# Altium footprint library North POLE.PcbLib: 419 footprints (part 8 of 27)
Each footprint in its own frame and in the unit in brackets; x right, y up, seen from the top. Pads: shape width x height; smd on the part's side, far side on the other; paste and mask are expansions set on the pad; w line width, h text height; cw(c..) or ccw(c..) is an arc to the next point about the centre after c.
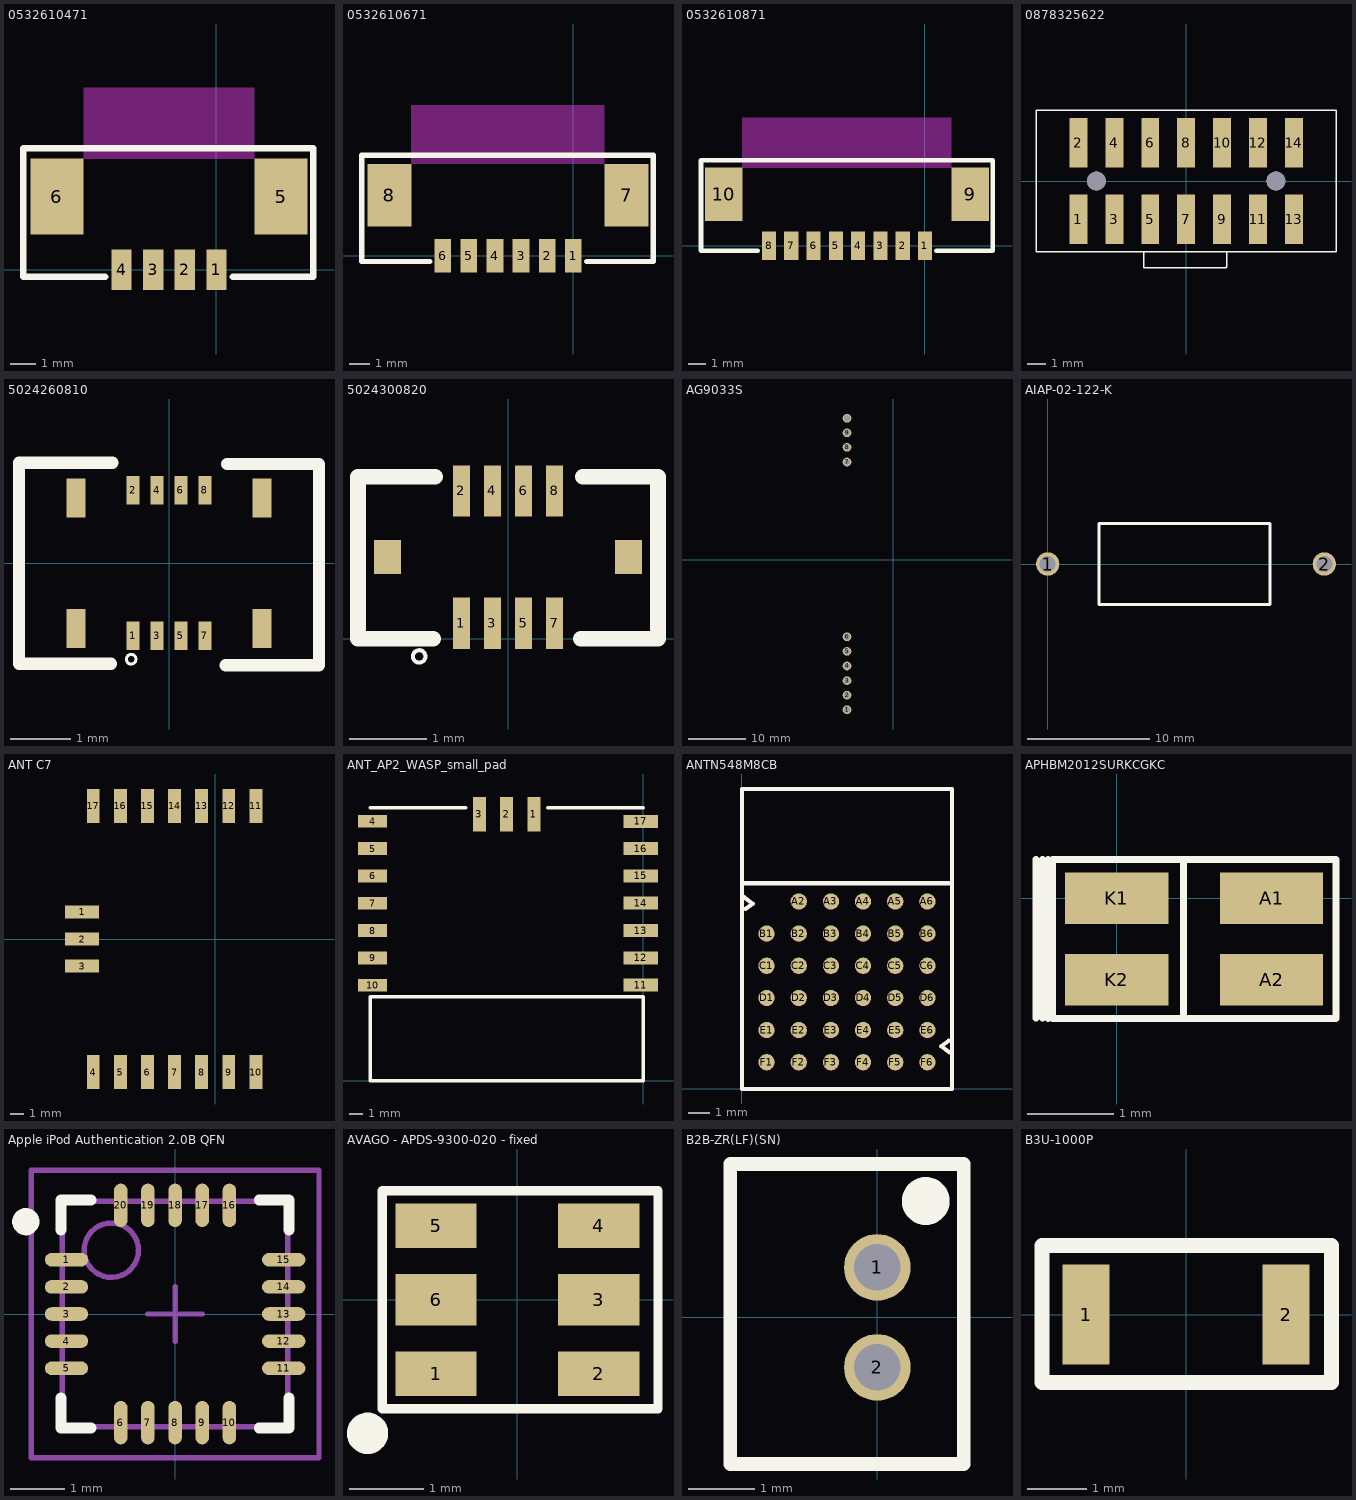
[diagram p7: the footprints below, top view; thin cyan lines are the x and y axes]

## 0532610471 [mm]
pads (6):
  rect 0.8x1.6 smd paste-0.05 mask+0.1: 1(0,0) 2(-1.25,0) 3(-2.5,0) 4(-3.75,0)
  rect 2.1x3 smd paste-0.05 mask+0.1: 5(2.55,2.9) 6(-6.3,2.9)
Top Overlay:
  lines w0.254: -4.4,-0.275 -7.625,-0.275 -7.625,4.805 3.82,4.805 3.82,-0.275 0.645,-0.275
Keep-Out Layer:
  region: -5.25,4.399 -5.25,7.193 1.483,7.193 1.483,4.399
3D body: height 3.4, standoff 0, extent -6.95,-0.35 3.2,4.85

## 0532610671 [mm]
pads (8):
  rect 0.8x1.6 smd paste-0.05 mask+0.1: 1(0,0) 2(-1.25,0) 3(-2.5,0) 4(-3.75,0) 5(-5,0) 6(-6.25,0)
  rect 2.1x3 smd paste-0.05 mask+0.1: 7(2.55,2.9) 8(-8.8,2.9)
Top Overlay:
  lines w0.254: -6.875,-0.275 -10.125,-0.275 -10.125,4.805 3.82,4.805 3.82,-0.275 0.645,-0.275
Keep-Out Layer:
  region: -7.75,4.399 -7.75,7.193 1.483,7.193 1.483,4.399
3D body: height 3.4, standoff 0, extent -9.45,-0.35 3.2,4.85

## 0532610871 [mm]
pads (10):
  rect 0.8x1.6 smd paste-0.05 mask+0.1: 1(0,0) 2(-1.25,0) 3(-2.5,0) 4(-3.75,0) 5(-5,0) 6(-6.25,0) 7(-7.5,0) 8(-8.75,0)
  rect 2.1x3 smd paste-0.05 mask+0.1: 9(2.55,2.9) 10(-11.3,2.9)
Top Overlay:
  lines w0.254: -9.375,-0.275 -12.575,-0.275 -12.575,4.805 3.82,4.805 3.82,-0.275 0.645,-0.275
Keep-Out Layer:
  region: -10.25,4.399 -10.25,7.193 1.483,7.193 1.483,4.399
3D body: height 3.4, standoff 0, extent -11.95,-0.45 3.2,4.75

## 0878325622 [mm]
pads (16):
  rect 1x2.75 smd mask+0.08: 1(-6,-2.125) 2(-6,2.125) 3(-4,-2.125) 4(-4,2.125) 5(-2,-2.125) 6(-2,2.125) 7(0,-2.125) 8(0,2.125) 9(2,-2.125) 10(2,2.125) 11(4,-2.125) 12(4,2.125) 13(6,-2.125) 14(6,2.125)
  round 1.05 hole 1.05 unplated mask+0.08: ""(-5,0) ""(5,0)
Top Overlay:
  lines w0.076: -2.365,-3.95 -2.365,-4.832 2.209,-4.832 2.265,-4.776 2.265,-3.964 ; -8.365,-3.946 -8.365,3.946 8.35,3.946 8.35,-3.946 -8.365,-3.946

## 5024260810 [mm] "CONN 0.4MM BTB PLUG 8POS SMD"
height 0.8
pads (12):
  rect 0.22x0.475 smd: 1(-0.6,-1.212) 2(-0.6,1.212) 3(-0.2,-1.212) 4(-0.2,1.212) 5(0.2,-1.212) 6(0.2,1.212) 7(0.6,-1.212) 8(0.6,1.212)
  rect 0.32x0.65 smd: ""(-1.55,-1.085) ""(-1.55,1.085) ""(1.55,-1.085) ""(1.55,1.085)
Top Overlay:
  circle w0.051: c-0.63,-1.6 r0.08
  lines w0.203: -0.968,-1.677 -2.5,-1.674 -2.5,1.674 -0.939,1.676 ; 0.942,-1.701 2.5,-1.699 2.5,1.65 0.965,1.652
3D body: height 1, standoff 0, extent -2.35,-1.3 2.35,1.3

## 5024300820 [mm] "CONN 0.4MM BTB PLUG 8POS SMD"
height 0.8
pads (10):
  rect 0.22x0.66 smd: 1(-0.6,0.2) 2(-0.6,1.9) 3(-0.2,0.2) 4(-0.2,1.9) 5(0.2,0.2) 6(0.2,1.9) 7(0.6,0.2) 8(0.6,1.9)
  rect 0.35x0.44 smd: ""(-1.55,1.05) ""(1.55,1.05)
Top Overlay:
  circle w0.051: c-1.143,-0.229 r0.08
  lines w0.203: -0.965,0 -1.93,0.002 -1.93,2.081 -0.94,2.083 ; 0.94,0 1.93,0.001 1.93,2.081 0.965,2.083
3D body: height 0.78, standoff -0.02, extent -1.93,0.002 1.93,2.081

## AG9033S [mm]
pads (10):
  round 1.5 hole 1.1 mask+0.08: 1(-8.091,-26.14) 2(-8.091,-23.6) 3(-8.091,-21.06) 4(-8.091,-18.52) 5(-8.091,-15.98) 6(-8.091,-13.44) 7(-8.091,17.04) 8(-8.091,19.58) 9(-8.091,22.12) 10(-8.091,24.66)
3D body: height 13.97, standoff 0, extent -13.091,-27.94 0,27.94
3D body: height 13.97, standoff 0, extent -16.154,-27.94 -13.091,27.94

## AIAP-02-122-K [mil] "INDUCTOR 1200UH .35A 10% AXIAL"
pads (2):
  round 75 hole 51: 1(0,0) 2(890,0)
Top Overlay:
  lines w10: 165,-130 715,-130 715,130 165,130 165,0 165,-130

## ANT C7 [mm]
pads (17):
  rect 2.5x0.95 smd: 1(-9.82,2) 2(-9.82,0) 3(-9.82,-2)
  rect 0.95x2.5 smd: 4(-9,-9.82) 5(-7,-9.82) 6(-5,-9.82) 7(-3,-9.82) 8(-1,-9.82) 9(1,-9.82) 10(3,-9.82) 11(3,9.82) 12(1,9.82) 13(-1,9.82) 14(-3,9.82) 15(-5,9.82) 16(-7,9.82) 17(-9,9.82)
3D body: height 2.6, standoff 0, extent -8.412,-8.481 3.513,8.506
3D body: height 0.8, standoff 0, extent -10,-10 10,10

## ANT_AP2_WASP_small_pad [mm]
pads (17):
  rect 0.95x2.51 smd paste-0.05 mask+0.1: 1(-8.014,19.507) 2(-10.014,19.507) 3(-12.014,19.507)
  rect 2.134x0.94 smd paste-0.051 mask+0.254: 4(-19.83,19) 5(-19.83,17) 6(-19.83,15) 7(-19.83,13) 8(-19.83,11) 9(-19.83,9) 10(-19.83,7)
  rect 2.51x0.95 smd paste-0.05 mask+0.1: 11(-0.19,7) 12(-0.19,9) 13(-0.19,11) 14(-0.19,13) 15(-0.19,15) 16(-0.19,17) 17(-0.19,19)
Top Overlay:
  lines w0.254: -20.01,20 -13.01,20 ; -7,20 0,20 ; -20,0 -20,6.16 0,6.16 0,0 -20,0

## ANTN548M8CB [mm] "Nordic ant module"
height 1.91
pads (35):
  round 0.762 smd: A2(2.65,8.75) A3(4.15,8.75) A4(5.65,8.75) A5(7.15,8.75) A6(8.65,8.75) B1(1.15,7.25) B2(2.65,7.25) B3(4.15,7.25) B4(5.65,7.25) B5(7.15,7.25) B6(8.65,7.25) C1(1.15,5.75) C2(2.65,5.75) C3(4.15,5.75) C4(5.65,5.75) C5(7.15,5.75) C6(8.65,5.75) D1(1.15,4.25) D2(2.65,4.25) D3(4.15,4.25) D4(5.65,4.25) D5(7.15,4.25) D6(8.65,4.25) E1(1.15,2.75) E2(2.65,2.75) E3(4.15,2.75) E4(5.65,2.75) E5(7.15,2.75) E6(8.65,2.75) F1(1.15,1.25) F2(2.65,1.25) F3(4.15,1.25) F4(5.65,1.25) F5(7.15,1.25) F6(8.65,1.25)
Top Overlay:
  lines w0.203: 0,9.6 9.8,9.6 ; 0.1,8.95 0.5,8.65 0.15,8.4 ; 9.65,2.25 9.3,2 9.7,1.7 ; 0,0 0,14 9.8,14 9.8,0 0,0

## APHBM2012SURKCGKC [mm] "bi-color 0805 led"
pads (4):
  rect 1.2x0.6 smd: A1(1.8,0) A2(1.8,-0.95) K1(0,0) K2(0,-0.95)
Top Overlay:
  lines w0.08: -0.94,-1.397 -0.94,0.453 ; -0.864,-1.397 -0.864,0.453 ; -0.8,-1.4 -0.8,0.45 ; 0.775,-1.4 0.775,0.45 ; -0.75,-1.4 -0.75,0.45 2.55,0.45 2.55,-1.4 -0.75,-1.4
3D body: height 0.4, standoff 0, extent -0.75,-1.4 2.55,0.45

## Apple iPod Authentication 2.0B QFN [mm]
pads (20):
  oval 0.8x0.25 smd: 1(-2,1) 2(-2,0.5) 3(-2,0) 4(-2,-0.5) 5(-2,-1) 11(2,-1) 12(2,-0.5) 13(2,0) 14(2,0.5) 15(2,1)
  oval 0.25x0.8 smd: 6(-1,-2) 7(-0.5,-2) 8(0,-2) 9(0.5,-2) 10(1,-2) 16(1,2) 17(0.5,2) 18(0,2) 19(-0.5,2) 20(-1,2)
Top Overlay:
  circle w0.25: c-2.75,1.7 r0.125
  lines w0.2: -2.1,-1.55 -2.1,-2.1 -1.55,-2.1 ; -2.1,1.55 -2.1,2.1 -1.55,2.1 ; 1.55,-2.1 2.1,-2.1 2.1,-1.55 ; 1.55,2.1 2.1,2.1 2.1,1.55
Mechanical 13:
  circle w0.1: c-1.175,1.175 r0.5
  lines w0.1: -2.075,-2.075 2.075,-2.075 2.075,2.075 -2.075,2.075 -2.075,-2.075
Mechanical 15:
  lines w0.1: -0.5,0 0.5,0 ; 0,-0.5 0,0.5 ; -2.65,-2.65 2.65,-2.65 2.65,2.65 -2.65,2.65 -2.65,-2.65
3D body: height 1, standoff 0, extent -2.075,-2.075 2.075,2.075

## AVAGO - APDS-9300-020 - fixed [mm]
pads (6):
  rect 1.1x0.6 smd: 1(-1.1,-1) 2(1.1,-1) 4(1.1,1) 5(-1.1,1)
  rect 1.1x0.7 smd: 3(1.1,0) 6(-1.1,0)
Top Overlay:
  lines w0.127: -1.825,-1.475 1.9,-1.475 1.9,1.475 -1.825,1.475 -1.825,-1.475
  lines w0.3: -1.99,-1.681 ccw(c-2.025,-1.805) -1.95,-1.7
3D body: height 0.55, standoff 0, extent -1.143,-1.168 1.245,1.194

## B2B-ZR(LF)(SN) [mm] "0.156-inch-separation 1x2 header with shroud"
pads (2):
  round 1 hole 0.7: 1(0,0.75) 2(0,-0.75)
Top Overlay:
  lines w0.203: -2.205,-2.199 -2.205,2.301 1.295,2.301 1.295,-2.199 -2.205,-2.199
  lines w0.508: 0.781,1.834 ccw(c0.726,1.745) 0.813,1.803
3D body: height 4.5, standoff -2.7, extent -2.205,-2.199 1.295,2.301

## B3U-1000P [mm]
pads (2):
  rect 0.8x1.7 smd: 1(-1.7,0) 2(1.7,0)
Top Overlay:
  lines w0.254: -2.45,-1.155 2.47,-1.155 2.47,1.175 -2.45,1.175 -2.45,-1.155